# Altium footprint library CryptLib.PcbLib: 52 footprints (part 4 of 4)
Each footprint in its own frame and in the unit in brackets; x right, y up, seen from the top. Pads: shape width x height; smd on the part's side, far side on the other; paste and mask are expansions set on the pad; w line width, h text height; cw(c..) or ccw(c..) is an arc to the next point about the centre after c.
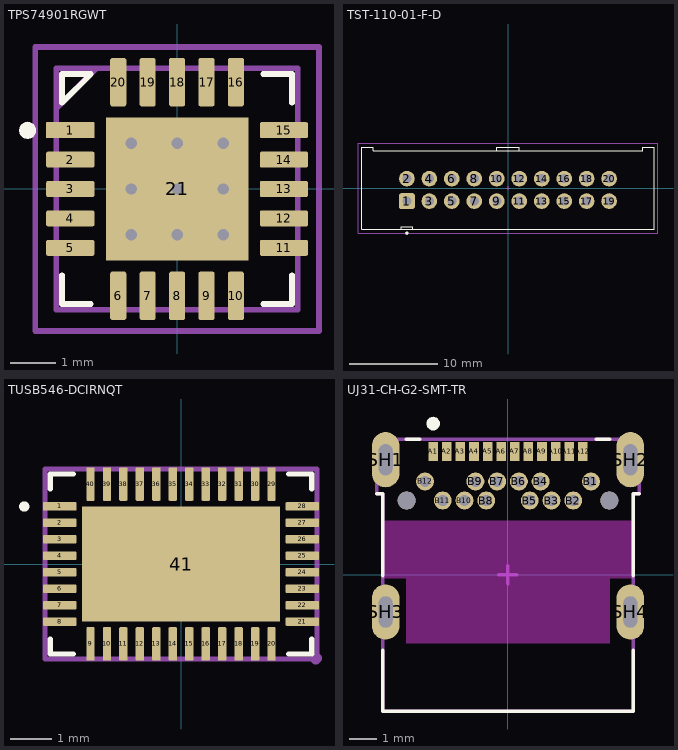
[diagram p3: the footprints below, top view; thin cyan lines are the x and y axes]

## TPS74901RGWT [mil]
pads (23):
  rrect10% 42x14 smd: 1(-92.91,51.18)
  rrect25% 42x14 smd: 2(-92.91,25.59) 3(-92.91,0) 4(-92.91,-25.59) 5(-92.91,-51.18) 11(92.91,-51.18) 12(92.91,-25.59) 13(92.91,0) 14(92.91,25.59) 15(92.91,51.18)
  rrect25% 14x42 smd: 6(-51.18,-92.91) 7(-25.59,-92.91) 8(0,-92.91) 9(25.59,-92.91) 10(51.18,-92.91) 16(51.18,92.91) 17(25.59,92.91) 18(0,92.91) 19(-25.59,92.91) 20(-51.18,92.91)
  rect 124x124 smd paste-999: 21(0,0)
  round 15 on Top Overlay: ""(-130,51)
  round 7.5 on Mech8: ""(-92.91,51.18)
via -40,40 diameter 20 hole 10
via 40,-40 diameter 20 hole 10
via 0,-40 diameter 20 hole 10
via -40,-40 diameter 20 hole 10
via -40,0 diameter 20 hole 10
via 0,40 diameter 20 hole 10
via 40,40 diameter 20 hole 10
via 40,0 diameter 20 hole 10
via 0,0 diameter 20 hole 10
Top Overlay:
  lines w5: -100,-75 -100,-100 -75,-100 ; 75,-100 100,-100 100,-75 ; 75,100 100,100 100,75 ; -100,75 -100,100 -75,100 -100,75
Top Paste:
  region: 47.05,-47.05 7.68,-47.05 7.68,-7.68 47.05,-7.68
  region: 47.05,7.68 7.68,7.68 7.68,47.05 47.05,47.05
  region: -7.68,7.68 -47.05,7.68 -47.05,47.05 -7.68,47.05
  region: -7.68,-47.05 -47.05,-47.05 -47.05,-7.68 -7.68,-7.68
Top Designator:
  text "'.Designator'" at -113.3,-8.33 h20
Top Assembly:
  lines w5: -105,70 -70,105 ; -105,-105 -105,105 105,105 105,-105 -105,-105
Top Courtyard (Mech10):
  lines w5: -123.43,-123.43 -123.43,123.43 123.43,123.43 123.43,-123.43 -123.43,-123.43
3D body "TPS74901RGWT.STEP": height 39.87, standoff 0.5, extent -98.42,-98.42 98.43,98.43

## TST-110-01-F-D [mil]
pads (22):
  rrect25% 70x70 hole 40: 1(-450,-57.48)
  round 70 hole 40: 2(-450,42.52) 3(-350,-57.48) 4(-350,42.52) 5(-250,-57.48) 6(-250,42.52) 7(-150,-57.48) 8(-150,42.52) 9(-50,-57.48) 10(-50,42.52) 11(50,-57.48) 12(50,42.52) 13(150,-57.48) 14(150,42.52) 15(250,-57.48) 16(250,42.52) 17(350,-57.48) 18(350,42.52) 19(450,-57.48) 20(450,42.52)
  round 15 on Top Overlay: ""(-450,-200)
  round 7.5 on Mech8: ""(-450,-57.48)
Top Overlay:
  lines w5: -50,167.48 -50,182.52 50,182.52 50,167.48 ; -475,-182.52 -475,-172.52 ; -475,-182.52 -475,-172.52 ; -475,-182.52 -650,-182.52 -650,182.52 -600,182.52 -600,167.48 -400,167.48 -300,167.48 -200,167.48 -100,167.48 0,167.48 100,167.48 200,167.48 300,167.48 400,167.48 600,167.48 600,182.52 650,182.52 650,-182.52 400,-182.52 300,-182.52 200,-182.52 100,-182.52 0,-182.52 -100,-182.52 -200,-182.52 -300,-182.52 -400,-182.52 -425,-182.52 ; -475,-182.52 -425,-182.52 ; -475,-172.52 -425,-172.52 ; -475,-172.52 -425,-172.52 ; -425,-182.52 -425,-172.52 ; -425,-182.52 -425,-172.52
Top Solder:
  circle w0: c-450,-57.48 r33.9
  circle w0: c-450,42.52 r33.9
  circle w0: c-350,-57.48 r33.9
  circle w0: c-350,42.52 r33.9
  circle w0: c-250,-57.48 r33.9
  circle w0: c-250,42.52 r33.9
  circle w0: c-150,-57.48 r33.9
  circle w0: c-150,42.52 r33.9
  circle w0: c-50,-57.48 r33.9
  circle w0: c-50,42.52 r33.9
  circle w0: c50,-57.48 r33.9
  circle w0: c50,42.52 r33.9
  circle w0: c150,-57.48 r33.9
  circle w0: c150,42.52 r33.9
  circle w0: c250,-57.48 r33.9
  circle w0: c250,42.52 r33.9
  circle w0: c350,-57.48 r33.9
  circle w0: c350,42.52 r33.9
  circle w0: c450,-57.48 r33.9
  circle w0: c450,42.52 r33.9
Bottom Solder:
  circle w0: c-450,-57.48 r33.9
  circle w0: c-450,42.52 r33.9
  circle w0: c-350,-57.48 r33.9
  circle w0: c-350,42.52 r33.9
  circle w0: c-250,-57.48 r33.9
  circle w0: c-250,42.52 r33.9
  circle w0: c-150,-57.48 r33.9
  circle w0: c-150,42.52 r33.9
  circle w0: c-50,-57.48 r33.9
  circle w0: c-50,42.52 r33.9
  circle w0: c50,-57.48 r33.9
  circle w0: c50,42.52 r33.9
  circle w0: c150,-57.48 r33.9
  circle w0: c150,42.52 r33.9
  circle w0: c250,-57.48 r33.9
  circle w0: c250,42.52 r33.9
  circle w0: c350,-57.48 r33.9
  circle w0: c350,42.52 r33.9
  circle w0: c450,-57.48 r33.9
  circle w0: c450,42.52 r33.9
Top Designator:
  text "'.Designator'" at -113.3,-8.33 h20
Top Assembly:
  lines w5: -8,0 8,0 ; 0,-8 0,8 ; -667.72,-200.24 -667.72,200.24 667.72,200.24 667.72,-200.24 -667.72,-200.24
3D body "TST-110-01-F-D.stp": height 350.5, standoff -129.5, extent -650,-182.48 650,182.52

## TUSB546-DCIRNQT [mil]
pads (43):
  rrect10% 32x8 smd: 1(-116,55.12)
  rrect25% 32x8 smd: 2(-116,39.37) 3(-116,23.62) 4(-116,7.87) 5(-116,-7.87) 6(-116,-23.62) 7(-116,-39.37) 8(-116,-55.12) 21(116,-55.12) 22(116,-39.37) 23(116,-23.62) 24(116,-7.87) 25(116,7.87) 26(116,23.62) 27(116,39.37) 28(116,55.12)
  rrect25% 8x32 smd: 9(-86.61,-76.5) 10(-70.87,-76.5) 11(-55.12,-76.5) 12(-39.37,-76.5) 13(-23.62,-76.5) 14(-7.87,-76.5) 15(7.87,-76.5) 16(23.62,-76.5) 17(39.37,-76.5) 18(55.12,-76.5) 19(70.87,-76.5) 20(86.61,-76.5) 29(86.61,76.5) 30(70.87,76.5) 31(55.12,76.5) 32(39.37,76.5) 33(23.62,76.5) 34(7.87,76.5) 35(-7.87,76.5) 36(-23.62,76.5) 37(-39.37,76.5) 38(-55.12,76.5) 39(-70.87,76.5) 40(-86.61,76.5)
  rect 189x110 smd paste-999: 41(0,0)
  round 10 on Top Overlay: ""(-150,55)
  round 7.5 on Mech8: ""(-116,55.12)
Top Overlay:
  lines w5: -125,-72 -125,-86 -103,-86 ; -125,72 -125,86 -103,86 ; 103,-86 125,-86 125,-72 ; 103,86 125,86 125,72
Top Paste:
  region: -35.44,51.06 -90.56,51.06 -90.56,3.94 -35.44,3.94
  region: -35.44,-3.94 -90.56,-3.94 -90.56,-51.06 -35.44,-51.06
  region: 27.56,51.06 -27.56,51.06 -27.56,3.94 27.56,3.94
  region: 27.56,-3.94 -27.56,-3.94 -27.56,-51.06 27.56,-51.06
  region: 90.56,51.06 35.44,51.06 35.44,3.94 90.56,3.94
  region: 90.56,-3.94 35.44,-3.94 35.44,-51.06 90.56,-51.06
Top Designator:
  text "'.Designator'" at -113.3,-8.33 h20
Top Assembly:
  lines w5: -8,0 8,0 ; 0,-8 0,8 ; 129,-91 -130,-91 -130,91 130,91 130,-90
  lines w10: 129,-91 130,-90
3D body "RNQ0040A.stp": height 31.5, standoff 0, extent -118.1,-78.73 118.12,78.75

## UJ31-CH-G2-SMT-TR [mil]
pads (32):
  rect 13.78x27.56 smd: A1(-108,179) A2(-88.31,179) A3(-68.63,179) A4(-48.94,179) A5(-29.26,179) A6(-9.57,179) A7(10.11,179) A8(29.8,179) A9(49.48,179) A10(69.17,179) A11(88.85,179) A12(108.54,179)
  round 26 hole 16: B1(120.35,135.3) B2(94.76,107.74) B3(63.26,107.74) B4(47.51,135.3) B5(31.76,107.74) B6(16.02,135.3) B7(-15.48,135.3) B8(-31.23,107.74) B9(-46.98,135.3) B10(-62.72,107.74) B11(-94.22,107.74) B12(-119.81,135.3)
  oval 40x80 hole 20 slot 45 at 90 deg: SH1(-176.9,166.8) SH2(177.43,166.8) SH3(-176.9,-53.68) SH4(177.43,-53.68)
  round 26 hole 26 unplated: ""(-146.39,107.74) ""(146.92,107.74)
  round 7.5 on Mech8: ""(-108,179)
  round 20 on Top Overlay: ""(-108,219)
Top Overlay:
  lines w5: -189.69,117.58 -180.83,117.58 -180.83,-1 ; -180.83,-108.8 -180.83,-197.38 181.37,-197.38 181.37,-108.8 ; -147.37,196.32 -127.69,196.32 ; 128.22,196.32 147.91,196.32 ; 181.37,-1 181.37,117.58 190.23,117.58
Keep-Out Layer:
  region: 181.37,-4.46 147.91,-4.46 147.91,-98.95 -147.37,-98.95 -147.37,-4.46 -180.83,-4.46 -180.83,78.21 181.37,78.21
  region: 181.37,-4.46 147.91,-4.46 147.91,-98.95 -147.37,-98.95 -147.37,-4.46 -180.83,-4.46 -180.83,78.21 181.37,78.21
Top Designator:
  text "'.Designator'" at -113.3,-8.33 h20
Top Assembly:
  lines w5: -13,0 13,0 ; 0,-13 0,13 ; -189.69,117.58 -180.83,117.58 -180.83,-197.38 181.37,-197.38 181.37,117.58 190.23,117.58 190.23,196.32 -189.69,196.32 -189.69,117.58
3D body "CUI_DEVICES_UJ31-CH-G2-SMT-TR.step": height 176.09, standoff -46.74, extent -190.91,-197.38 191.45,196.32